# Altium footprint library ACTION_IC.PcbLib: 135 footprints (part 3 of 9)
Each footprint in its own frame and in the unit in brackets; x right, y up, seen from the top. Pads: shape width x height; smd on the part's side, far side on the other; paste and mask are expansions set on the pad; w line width, h text height; cw(c..) or ccw(c..) is an arc to the next point about the centre after c.
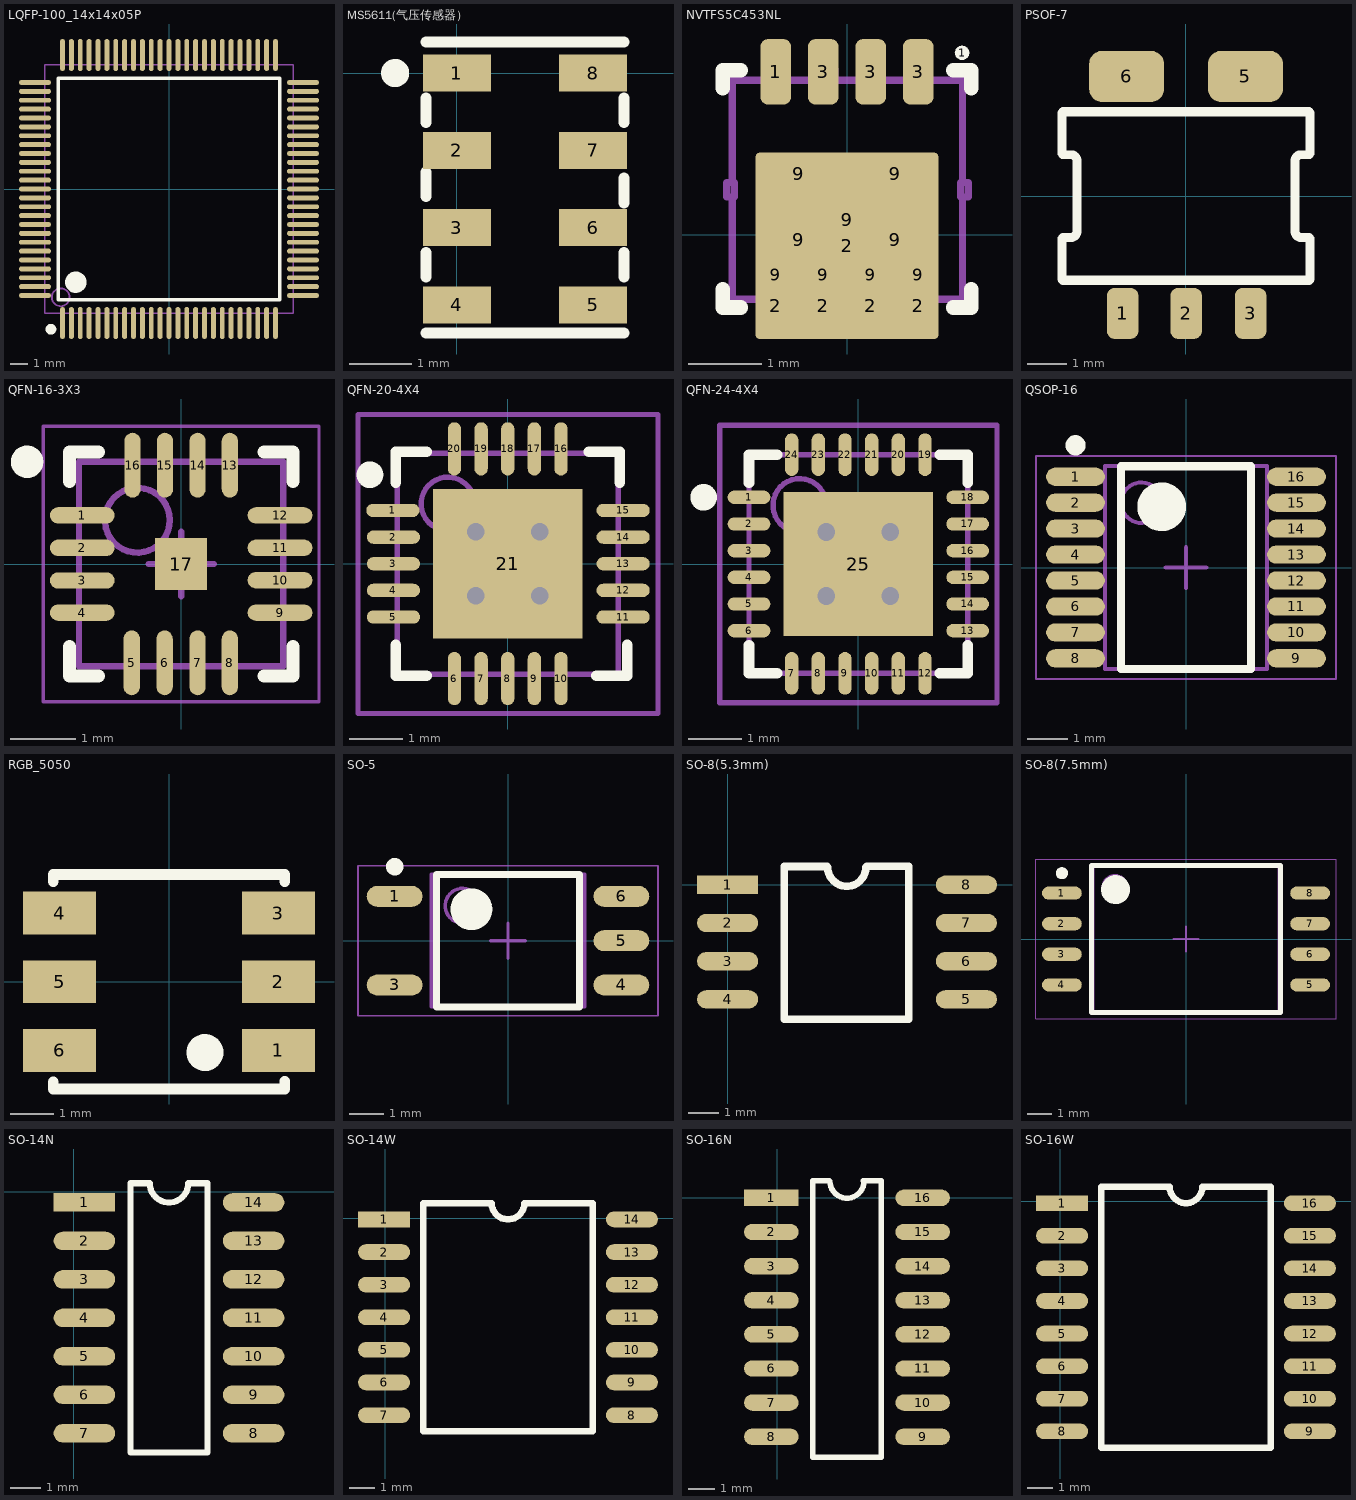
[diagram p2: the footprints below, top view; thin cyan lines are the x and y axes]

## LQFP-100_14x14x05P [mm]
pads (100):
  oval 0.28x1.8 smd mask+0.051: 1(-6,-7.55) 2(-5.5,-7.55) 3(-5,-7.55) 4(-4.5,-7.55) 5(-4,-7.55) 6(-3.5,-7.55) 7(-3,-7.55) 8(-2.5,-7.55) 9(-2,-7.55) 10(-1.5,-7.55) 11(-1,-7.55) 12(-0.5,-7.55) 13(0,-7.55) 14(0.5,-7.55) 15(1,-7.55) 16(1.5,-7.55) 17(2,-7.55) 18(2.5,-7.55) 19(3,-7.55) 20(3.5,-7.55) 21(4,-7.55) 22(4.5,-7.55) 23(5,-7.55) 24(5.5,-7.55) 25(6,-7.55) 51(6,7.55) 52(5.5,7.55) 53(5,7.55) 54(4.5,7.55) 55(4,7.55) 56(3.5,7.55) 57(3,7.55) 58(2.5,7.55) 59(2,7.55) 60(1.5,7.55) 61(1,7.55) 62(0.5,7.55) 63(0,7.55) 64(-0.5,7.55) 65(-1,7.55) 66(-1.5,7.55) 67(-2,7.55) 68(-2.5,7.55) 69(-3,7.55) 70(-3.5,7.55) 71(-4,7.55) 72(-4.5,7.55) 73(-5,7.55) 74(-5.5,7.55) 75(-6,7.55)
  oval 1.8x0.28 smd mask+0.051: 26(7.55,-6) 27(7.55,-5.5) 28(7.55,-5) 29(7.55,-4.5) 30(7.55,-4) 31(7.55,-3.5) 32(7.55,-3) 33(7.55,-2.5) 34(7.55,-2) 35(7.55,-1.5) 36(7.55,-1) 37(7.55,-0.5) 38(7.55,0) 39(7.55,0.5) 40(7.55,1) 41(7.55,1.5) 42(7.55,2) 43(7.55,2.5) 44(7.55,3) 45(7.55,3.5) 46(7.55,4) 47(7.55,4.5) 48(7.55,5) 49(7.55,5.5) 50(7.55,6) 76(-7.55,6) 77(-7.55,5.5) 78(-7.55,5) 79(-7.55,4.5) 80(-7.55,4) 81(-7.55,3.5) 82(-7.55,3) 83(-7.55,2.5) 84(-7.55,2) 85(-7.55,1.5) 86(-7.55,1) 87(-7.55,0.5) 88(-7.55,0) 89(-7.55,-0.5) 90(-7.55,-1) 91(-7.55,-1.5) 92(-7.55,-2) 93(-7.55,-2.5) 94(-7.55,-3) 95(-7.55,-3.5) 96(-7.55,-4) 97(-7.55,-4.5) 98(-7.55,-5) 99(-7.55,-5.5) 100(-7.55,-6)
Top Overlay:
  circle w0.3: c-6.65,-7.9 r0.15
  circle w0.6: c-5.25,-5.25 r0.3
  lines w0.2: -6.25,-6.25 6.25,-6.25 6.25,6.25 -6.25,6.25 -6.25,-6.25
Mechanical 13:
  circle w0.1: c-6.1,-6.1 r0.5
  lines w0.1: -7,-7 7,-7 7,7 -7,7 -7,-7
3D body "User Library-LQFP100_Grid_0_5.STEP": height 1.6, standoff 0, extent -8,-8 8,8

## MS5611(气压传感器） [mm]
pads (8):
  rect 1.1x0.6 smd: 1(0,0) 2(0,-1.25) 3(0,-2.5) 4(0,-3.75) 5(2.2,-3.75) 6(2.2,-2.5) 7(2.2,-1.25) 8(2.2,0)
Top Overlay:
  circle w0.254: c-1,0 r0.1
  lines w0.178: -0.5,-4.2 2.7,-4.2 ; -0.5,-3.3 -0.5,-2.9 ; -0.5,-2 -0.5,-1.6 ; -0.5,-0.8 -0.5,-0.4 ; -0.5,0.5 2.7,0.5 ; 2.7,-3.3 2.7,-2.9 ; 2.7,-2.1 2.7,-1.7 ; 2.7,-0.8 2.7,-0.4

## NVTFS5C453NL [mm]
pads (19):
  rrect50% 0.42x0.9 smd paste-0.05 mask-0.05: 1(-0.975,2.229) 2(-0.975,-0.973) 2(-0.325,-0.973) 2(0.325,-0.973) 2(0.975,-0.973) 3(-0.325,2.229) 3(0.325,2.229) 3(0.975,2.229)
  round 0.2 on Top Overlay: 1(1.575,2.489)
  rrect4% 2.5x2.55 smd paste-1.5 mask-1.5: 2(0,-0.152)
  rect 0.3x0.5 on Top Solder: 9(-0.975,-0.547) 9(-0.325,-0.547) 9(0.325,-0.547) 9(0.975,-0.547)
  rrect14% 1.125x0.705 on Top Paste: 9(-0.663,-0.069) 9(-0.663,0.836) 9(0.662,-0.069) 9(0.662,0.836)
  rrect6% 2.45x1.775 on Top Solder: 9(0,0.203)
Top Overlay:
  lines w0.2: -1.7,-0.75 -1.7,-0.997 -1.453,-0.997 ; -1.7,2.006 -1.7,2.253 -1.453,2.253 ; 1.453,-0.997 1.7,-0.997 1.7,-0.75 ; 1.453,2.253 1.7,2.253 1.7,2.006
Mechanical 5:
  lines w0.1: -1.569,0.516 -1.569,-0.884 -1.119,-0.884 ; -1.569,0.716 -1.569,2.116 -1.119,2.116 ; -0.819,-0.884 -0.469,-0.884 ; -0.819,2.116 -0.469,2.116 ; -0.169,-0.884 0.181,-0.884 ; -0.169,2.116 0.181,2.116 ; 0.481,-0.884 0.831,-0.884 ; 0.481,2.116 0.831,2.116 ; 1.131,-0.884 1.581,-0.884 1.581,0.516 ; 1.131,2.116 1.581,2.116 1.581,0.716 ; -1.649,0.516 -1.649,0.716 -1.543,0.716 -1.543,0.516 -1.649,0.516 ; -1.119,-1.034 -1.119,-0.858 -0.819,-0.858 -0.819,-1.034 -1.119,-1.034 ; -1.119,2.089 -0.819,2.089 -0.819,2.266 -1.119,2.266 -1.119,2.089 ; -0.469,-1.034 -0.169,-1.034 -0.169,-0.858 -0.469,-0.858 -0.469,-1.034 ; -0.469,2.089 -0.169,2.089 -0.169,2.266 -0.469,2.266 -0.469,2.089 ; 0.181,-1.034 0.181,-0.858 0.481,-0.858 0.481,-1.034 0.181,-1.034 ; 0.181,2.089 0.481,2.089 0.481,2.266 0.181,2.266 0.181,2.089 ; 0.831,-1.034 0.831,-0.858 1.131,-0.858 1.131,-1.034 0.831,-1.034 ; 0.831,2.089 1.131,2.089 1.131,2.266 0.831,2.266 0.831,2.089 ; 1.554,0.516 1.554,0.716 1.661,0.716 1.661,0.516 1.554,0.516
3D body "DNH0008A.stp": height 0.91, standoff 0.01, extent -1.655,-1.022 1.655,2.278

## PSOF-7 [mm]
pads (5):
  rrect50% 0.8x1.3 smd: 1(-1.6,-2.972) 2(0.013,-2.972) 3(1.651,-2.972)
  rrect50% 1.9x1.3 smd: 5(1.52,3.048) 6(-1.5,3.048)
Top Overlay:
  lines w0.127: -3.09,-2.073 3.11,-2.073 ; -3.09,2.09 3.11,2.09 ; -3.19,-1.996 -3.09,-1.996 ; -3.19,-1.996 -3.19,-1.091 ; -3.19,-1.996 -3.19,-2.094 ccw(c-3.091,-2.093) -3.09,-2.192 ; -3.19,-1.091 cw(c-3.09,-1.091) -3.09,-0.991 ; -3.19,-1.091 -3.09,-1.091 ; -3.19,1.109 ccw(c-3.09,1.109) -3.09,1.009 ; -3.19,1.109 -3.09,1.109 ; -3.19,1.109 -3.19,2.014 ; -3.19,2.014 -3.09,2.014 ; -3.19,2.014 -3.19,2.112 cw(c-3.091,2.111) -3.09,2.21 ; -3.09,-2.192 3.11,-2.192 ; -3.09,-2.192 -3.09,-1.996 ; -3.09,-1.996 -3.09,-1.091 ; -3.09,-1.091 -3.09,-0.991 ; -3.09,-1.091 -2.91,-1.091 ; -3.09,-0.991 -2.91,-0.991 ; -3.09,1.009 -3.09,1.109 ; -3.09,1.009 -2.91,1.009 ; -3.09,1.109 -3.09,2.014 ; -3.09,1.109 -2.91,1.109 ; -3.09,2.014 -3.09,2.21 ; -3.09,2.21 3.11,2.21 ; -2.91,-1.091 ccw(c-2.909,-0.893) -2.71,-0.891 ; -2.91,-1.091 -2.91,-0.991 ; -2.91,-0.991 ccw(c-2.91,-0.891) -2.81,-0.891 ; -2.91,1.009 cw(c-2.91,0.909) -2.81,0.909 ; -2.91,1.009 -2.91,1.109 ; -2.91,1.109 cw(c-2.909,0.91) -2.71,0.909 ; -2.81,-0.891 -2.71,-0.891 ; -2.81,-0.891 -2.81,0.909 ; -2.81,0.909 -2.71,0.909 ; -2.71,-0.891 -2.71,0.909 ; 2.73,-0.891 ccw(c2.929,-0.893) 2.93,-1.091 ; 2.73,-0.891 2.83,-0.891 ; 2.73,-0.891 2.73,0.909 ; 2.73,0.909 cw(c2.929,0.91) 2.93,1.109 ; 2.73,0.909 2.83,0.909 ; 2.83,-0.891 ccw(c2.93,-0.891) 2.93,-0.991 ; 2.83,-0.891 2.83,0.909 ; 2.83,0.909 cw(c2.93,0.909) 2.93,1.009 ; 2.93,-1.091 2.93,-0.991 ; 2.93,-1.091 3.11,-1.091 ; 2.93,-0.991 3.11,-0.991 ; 2.93,1.009 2.93,1.109 ; 2.93,1.009 3.11,1.009 ; 2.93,1.109 3.11,1.109 ; 3.11,-2.192 ccw(c3.111,-2.093) 3.21,-2.094 3.21,-1.996 ; 3.11,-2.192 3.11,-1.996 ; 3.11,-1.996 3.21,-1.996 ; 3.11,-1.996 3.11,-1.091 ; 3.11,-1.091 3.21,-1.091 ; 3.11,-1.091 3.11,-0.991 ; 3.11,-0.991 cw(c3.11,-1.091) 3.21,-1.091 ; 3.11,1.009 ccw(c3.11,1.109) 3.21,1.109 ; 3.11,1.009 3.11,1.109 ; 3.11,1.109 3.21,1.109 ; 3.11,1.109 3.11,2.014 ; 3.11,2.014 3.11,2.21 ; 3.11,2.014 3.21,2.014 ; 3.11,2.21 cw(c3.111,2.111) 3.21,2.112 3.21,2.014 ; 3.21,-1.996 3.21,-1.091 ; 3.21,1.109 3.21,2.014
3D body "User Library-7-Pin PSOF Package.STEP": height 1.64, standoff 0.16, extent -3.175,-3.15 3.225,3.25

## QFN-16-3X3 [mm]
height 0.8
pads (17):
  oval 1x0.25 smd: 1(-1.524,0.75) 2(-1.524,0.25) 3(-1.524,-0.254) 4(-1.524,-0.75) 9(1.524,-0.75) 10(1.524,-0.25) 11(1.524,0.25) 12(1.524,0.75)
  oval 0.25x1 smd: 5(-0.762,-1.524) 6(-0.254,-1.524) 7(0.254,-1.524) 8(0.75,-1.524) 13(0.75,1.524) 14(0.254,1.524) 15(-0.25,1.524) 16(-0.75,1.524)
  rect 0.8x0.8 smd: 17(0,0)
Top Overlay:
  circle w0.25: c-2.375,1.575 r0.125
  lines w0.2: -1.725,-1.275 -1.725,-1.725 -1.275,-1.725 ; -1.725,1.275 -1.725,1.725 -1.275,1.725 ; 1.275,-1.725 1.725,-1.725 1.725,-1.275 ; 1.275,1.725 1.725,1.725 1.725,1.275
Mechanical 13:
  circle w0.1: c-0.675,0.675 r0.5
  lines w0.1: -1.575,-1.575 -1.575,1.575 1.575,1.575 1.575,-1.575 -1.575,-1.575
Mechanical 15:
  lines w0.05: -2.125,-2.125 -2.125,2.125 2.125,2.125 2.125,-2.125 -2.125,-2.125
  lines w0.1: -0.5,0 0.5,0 ; 0,-0.5 0,0.5
3D body: height 0.8, standoff 0.05, extent -1.575,-1.575 1.575,1.575

## QFN-20-4X4 [mm]
pads (21):
  oval 1x0.25 smd: 1(-2.155,1) 2(-2.145,0.5) 3(-2.145,0) 4(-2.145,-0.5) 5(-2.145,-1) 11(2.165,-1) 12(2.165,-0.5) 13(2.165,0) 14(2.165,0.5) 15(2.165,1)
  oval 0.25x1 smd: 6(-1,-2.155) 7(-0.5,-2.155) 8(0,-2.155) 9(0.5,-2.155) 10(1,-2.155) 16(1,2.155) 17(0.5,2.155) 18(0,2.155) 19(-0.5,2.155) 20(-1,2.155)
  rect 2.8x2.8 smd: 21(0,0)
via -0.6,0.6 diameter 0.66 hole 0.33
via 0.6,0.6 diameter 0.66 hole 0.33
via -0.6,-0.6 diameter 0.66 hole 0.33
via 0.6,-0.6 diameter 0.66 hole 0.33
Top Overlay:
  circle w0.25: c-2.585,1.67 r0.125
  lines w0.2: -2.1,-1.525 -2.1,-2.1 -1.525,-2.1 ; -2.1,1.525 -2.1,2.1 -1.525,2.1 ; 1.525,2.1 2.1,2.1 2.1,1.525 ; 1.665,-2.1 2.24,-2.1 2.24,-1.525
Mechanical 13:
  circle w0.1: c-1.125,1.125 r0.5
  lines w0.1: -2.075,-2.075 -2.075,2.075 2.075,2.075 2.075,-2.075 -2.075,-2.075
Mechanical 15:
  lines w0.1: -0.5,0 0.5,0 ; 0,-0.5 0,0.5 ; -2.81,-2.81 -2.81,2.8 2.82,2.8 2.82,-2.81 -2.81,-2.81
3D body "User Library-QFN20(4x4).STEP": height 0.9, standoff -0.02, extent -2,-2 2,2

## QFN-24-4X4 [mm]
pads (25):
  oval 0.8x0.25 smd: 1(-2.05,1.25) 2(-2.05,0.75) 3(-2.05,0.25) 4(-2.05,-0.25) 5(-2.05,-0.75) 6(-2.05,-1.25) 13(2.05,-1.25) 14(2.05,-0.75) 15(2.05,-0.25) 16(2.05,0.25) 17(2.05,0.75) 18(2.05,1.25)
  oval 0.25x0.8 smd: 7(-1.25,-2.05) 8(-0.75,-2.05) 9(-0.25,-2.05) 10(0.25,-2.05) 11(0.75,-2.05) 12(1.25,-2.05) 19(1.25,2.05) 20(0.75,2.05) 21(0.25,2.05) 22(-0.25,2.05) 23(-0.75,2.05) 24(-1.25,2.05)
  rect 2.8x2.7 smd: 25(0,0)
via 0.6,-0.6 diameter 0.66 hole 0.33
via -0.6,-0.6 diameter 0.66 hole 0.33
via 0.6,0.6 diameter 0.66 hole 0.33
via -0.6,0.6 diameter 0.66 hole 0.33
Top Overlay:
  circle w0.25: c-2.9,1.25 r0.125
  lines w0.2: -2.05,-1.525 -2.05,-2.05 -1.525,-2.05 ; -2.05,1.525 -2.05,2.05 -1.525,2.05 ; 1.525,-2.05 2.05,-2.05 2.05,-1.525 ; 1.525,2.05 2.05,2.05 2.05,1.525
Mechanical 13:
  circle w0.1: c-1.1,1.1 r0.5
  lines w0.1: -2.05,-2.05 2.05,-2.05 2.05,2.05 -2.05,2.05 -2.05,-2.05
Mechanical 15:
  lines w0.1: -0.5,0 0.5,0 ; 0,-0.5 0,0.5 ; -2.6,-2.6 2.6,-2.6 2.6,2.6 -2.6,2.6 -2.6,-2.6
3D body "MLF24.STEP": height 1, standoff 0, extent -2,-1.981 2,2.019

## QSOP-16 [mm]
height 1.75
pads (16):
  oval 1.45x0.45 smd: 1(-2.725,2.24) 2(-2.725,1.6) 3(-2.725,0.96) 4(-2.725,0.32) 5(-2.725,-0.32) 6(-2.725,-0.96) 7(-2.725,-1.6) 8(-2.725,-2.24) 9(2.725,-2.24) 10(2.725,-1.6) 11(2.725,-0.96) 12(2.725,-0.32) 13(2.725,0.32) 14(2.725,0.96) 15(2.725,1.6) 16(2.725,2.24)
Top Overlay:
  circle w0.6: c-0.6,1.5 r0.3
  circle w0.25: c-2.725,3.015 r0.125
  lines w0.2: -1.6,-2.5 1.6,-2.5 1.6,2.5 -1.6,2.5 -1.6,-2.5
Mechanical 13:
  circle w0.1: c-1.1,1.6 r0.5
  lines w0.1: -2,-2.5 2,-2.5 2,2.5 -2,2.5 -2,-2.5
Mechanical 15:
  lines w0.05: -3.7,-2.75 3.7,-2.75 3.7,2.75 -3.7,2.75 -3.7,-2.75
  lines w0.1: -0.5,0 0.5,0 ; 0,-0.5 0,0.5
3D body: height 1.75, standoff 0.1, extent -2,-2.5 2,2.5

## RGB_5050 [mm]
pads (6):
  rect 1.7x1 smd: 1(2.55,-1.6) 2(2.55,0) 3(2.55,1.6) 4(-2.55,1.6) 5(-2.55,0) 6(-2.55,-1.6)
Top Overlay:
  circle w0.5: c0.838,-1.651 r0.18
  lines w0.254: -2.7,-2.337 -2.7,-2.5 2.7,-2.5 2.7,-2.319 ; -2.7,2.337 -2.7,2.5 2.7,2.5 2.7,2.337
3D body: height 1, standoff 0.1, extent -2.692,-2.489 2.692,2.449

## SO-5 [mm]
height 4
pads (5):
  oval 1.6x0.6 smd: 1(-3.25,1.27) 3(-3.25,-1.27) 4(3.25,-1.27) 5(3.25,0) 6(3.25,1.27)
Top Overlay:
  circle w0.25: c-3.25,2.12 r0.125
  circle w0.6: c-1.05,0.9 r0.3
  lines w0.2: -2.05,-1.9 -2.05,1.9 2.05,1.9 2.05,-1.9 -2.05,-1.9
Mechanical 13:
  circle w0.1: c-1.3,1 r0.5
  lines w0.1: -2.2,-1.9 -2.2,1.9 2.2,1.9 2.2,-1.9 -2.2,-1.9
Mechanical 15:
  lines w0.05: -4.3,-2.15 -4.3,2.15 4.3,2.15 4.3,-2.15 -4.3,-2.15
  lines w0.1: -0.5,0 0.5,0 ; 0,-0.5 0,0.5
3D body: height 2.5, standoff 0.1, extent -2.2,-1.9 2.2,1.9

## SO-8(5.3mm) [mil]
pads (8):
  rect 80x24 smd: 1(0,0)
  oval 80x24 smd: 2(0,-50) 3(0,-100) 4(0,-150) 5(312.6,-150) 6(312.6,-100) 7(312.6,-50) 8(312.6,0)
Top Overlay:
  lines w10: 130.06,23.94 74.39,23.94 74.39,-176.06 237.01,-176.06 ; 131,23 ccw(c156,23) 181,23 ; 182,24 237.01,24 ; 236.01,23 237.01,24 ; 237.01,-176 237.01,24
3D body "User Library-SO-8W.STEP": height 76.77, standoff 0, extent 1.5,-179.33 312.52,29.33

## SO-8(7.5mm) [mm]
height 2.2
pads (8):
  oval 1.65x0.55 smd: 1(-5.15,1.905) 2(-5.15,0.635) 3(-5.15,-0.635) 4(-5.15,-1.905) 5(5.15,-1.905) 6(5.15,-0.635) 7(5.15,0.635) 8(5.15,1.905)
Top Overlay:
  circle w0.25: c-5.15,2.73 r0.125
  circle w0.6: c-2.925,2.05 r0.3
  lines w0.2: -3.925,-3.05 -3.925,3.05 3.925,3.05 3.925,-3.05 -3.925,-3.05
Mechanical 13:
  circle w0.1: c-2.95,2.15 r0.5
  lines w0.1: -3.85,-3.05 -3.85,3.05 3.85,3.05 3.85,-3.05 -3.85,-3.05
Mechanical 15:
  lines w0.05: -6.225,-3.3 -6.225,3.3 6.225,3.3 6.225,-3.3 -6.225,-3.3
  lines w0.1: -0.5,0 0.5,0 ; 0,-0.5 0,0.5
3D body: height 2.2, standoff 0.1, extent -3.85,-3.05 3.85,3.05

## SO-14N [mil]
pads (14):
  rect 80x24 smd: 1(14,-14)
  oval 80x24 smd: 2(14,-64) 3(14,-114) 4(14,-164) 5(14,-214) 6(14,-264) 7(14,-314) 8(234,-314) 9(234,-264) 10(234,-214) 11(234,-164) 12(234,-114) 13(234,-64) 14(234,-14)
Top Overlay:
  lines w8: 74,-339 174,-339 174,11 149,11 cw(c124,11) 99,11 74,11 74,-339
3D body "SOIC14.STEP": height 76.77, standoff 0, extent 6,-334.26 244.41,8.26

## SO-14W [mil]
pads (14):
  rect 80x24 smd: 1(-2,-2)
  oval 80x24 smd: 2(-2,-52) 3(-2,-102) 4(-2,-152) 5(-2,-202) 6(-2,-252) 7(-2,-302) 8(378,-302) 9(378,-252) 10(378,-202) 11(378,-152) 12(378,-102) 13(378,-52) 14(378,-2)
Top Overlay:
  lines w10: 58,-327 318,-327 318,23 213,23 cw(c188,23) 163,23 58,23 58,-327
3D body "User Library-SO-14W.STEP": height 102.36, standoff 0, extent -11.74,-333.14 395.74,25.13

## SO-16N [mil]
pads (16):
  rect 80x24 smd: 1(-9,0.1)
  oval 80x24 smd: 2(-9,-49.9) 3(-9,-99.9) 4(-9,-149.9) 5(-9,-199.9) 6(-9,-249.9) 7(-9,-299.9) 8(-9,-349.9) 9(212.9,-349.9) 10(212.9,-299.9) 11(212.9,-249.9) 12(212.9,-199.9) 13(212.9,-149.9) 14(212.9,-99.9) 15(212.9,-49.9) 16(212.9,0.1)
Top Overlay:
  lines w8: 51.9,24.72 51.9,-379.9 151.9,-379.9 151.9,24.72 ; 51.9,25.1 76,25.1 ; 76.9,24.72 ccw(c101.9,24.72) 126.9,24.72 ; 126,25.1 151.9,25.1
3D body "SOIC16.STEP": height 76.77, standoff 0, extent -21.2,-378.75 217.21,26.76

## SO-16W [mil]
pads (16):
  rect 80x24 smd: 1(3,-3)
  oval 80x24 smd: 2(3,-53) 3(3,-103) 4(3,-153) 5(3,-203) 6(3,-253) 7(3,-303) 8(3,-353) 9(383,-353) 10(383,-303) 11(383,-253) 12(383,-203) 13(383,-153) 14(383,-103) 15(383,-53) 16(383,-3)
Top Overlay:
  lines w10: 167.72,22 63,22 63,-378 323,-378 323,22 218,22 cw(c193,22) 168,22
3D body "User Library-SO-16W.STEP": height 97.64, standoff 0, extent -7,-380.35 398.91,26.35